# Altium footprint library ConnectMedical.PcbLib: 93 footprints (part 3 of 6)
Each footprint in its own frame and in the unit in brackets; x right, y up, seen from the top. Pads: shape width x height; smd on the part's side, far side on the other; paste and mask are expansions set on the pad; w line width, h text height; cw(c..) or ccw(c..) is an arc to the next point about the centre after c.
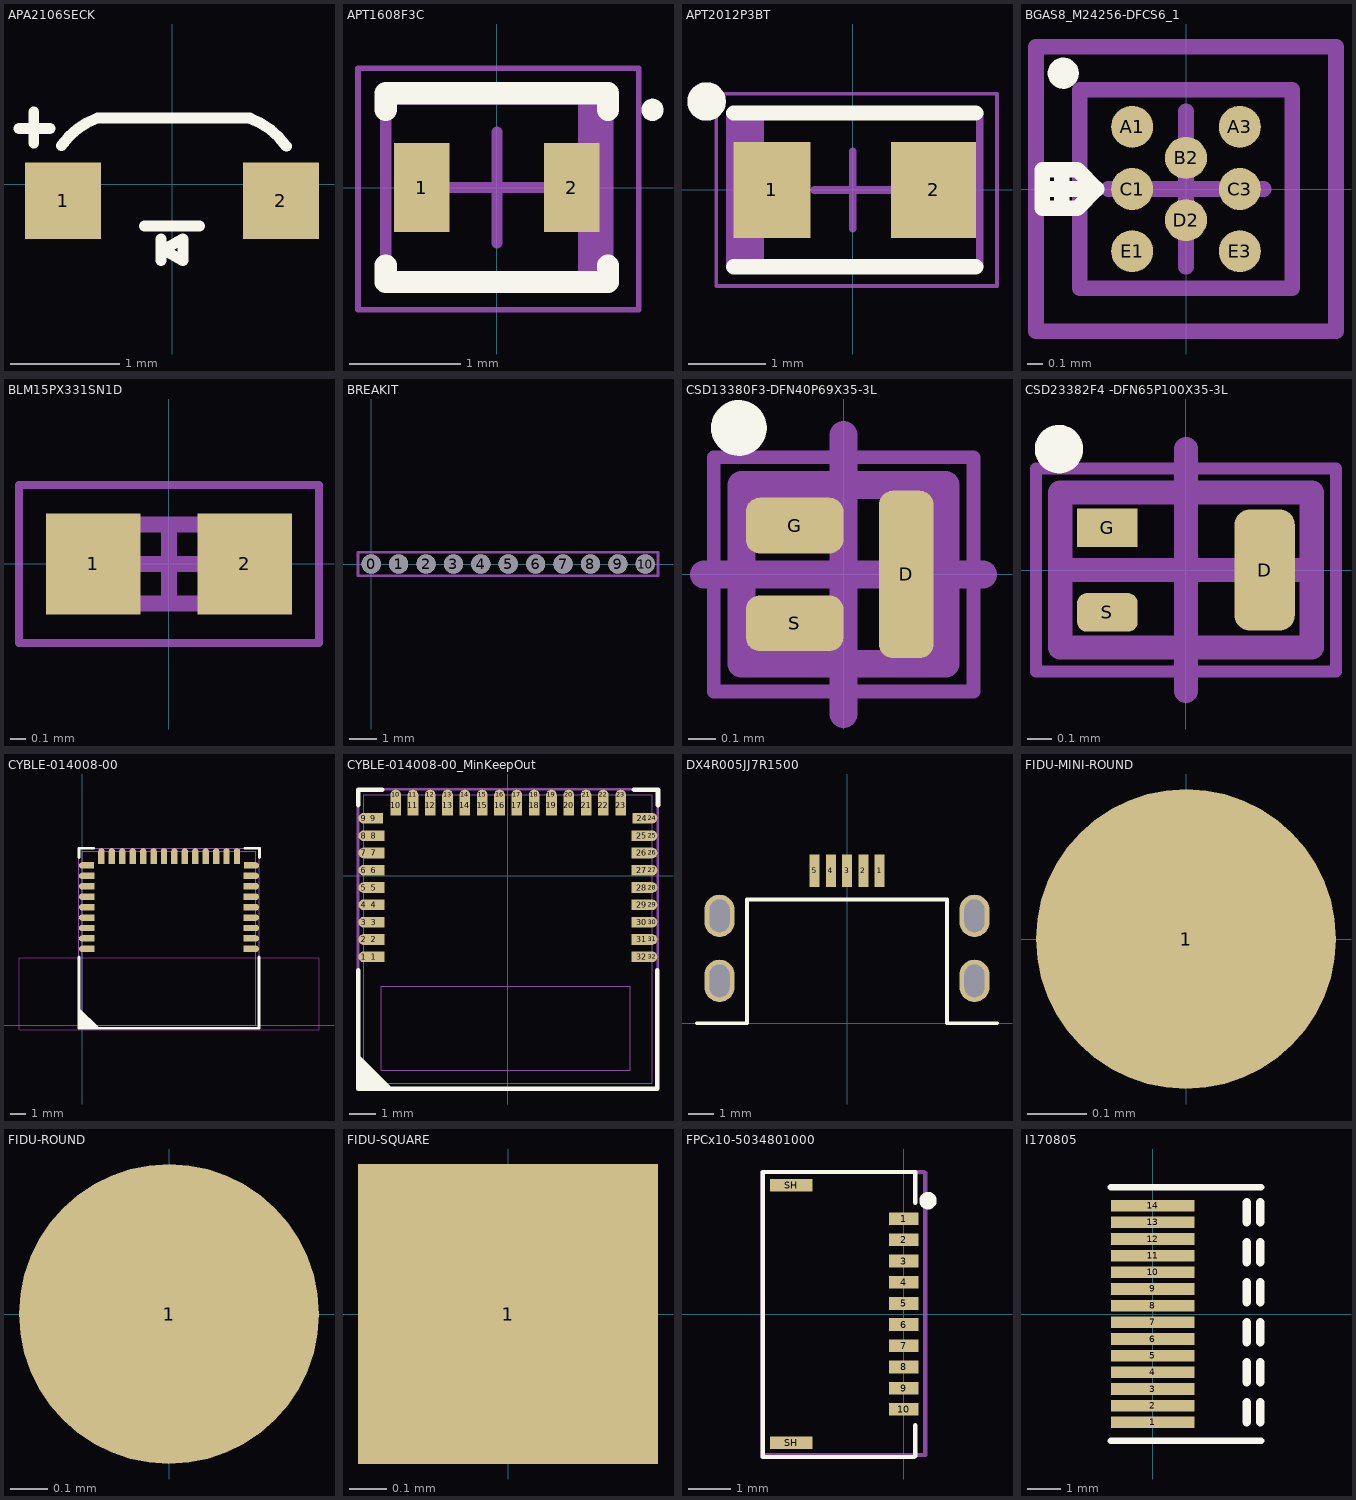
[diagram p2: the footprints below, top view; thin cyan lines are the x and y axes]

## APA2106SECK [mm] "LED_APA2106SECK"
pads (2):
  rect 0.7x0.7 smd: 1(-1,-0.15) 2(1,-0.15)
Top Overlay:
  lines w0.1: -1.405,0.514 -1.122,0.514 ; -1.27,0.381 -1.27,0.664 ; -1.017,0.354 cw(c-0.445,-0.046) -0.683,0.61 0.717,0.61 ; -0.254,-0.381 0.254,-0.381 ; -0.1,-0.7 -0.1,-0.5 ; 0.717,0.606 cw(c0.478,-0.051) 1.05,0.35 ; -0.078,-0.6 0.1,-0.7 0.1,-0.5 -0.078,-0.6
3D body "APA2106.STEP": height 0.59, standoff -0.01, extent -1.05,-0.366 1.05,0.635

## APT1608F3C [mm] "EMITTER IR 940NM 50MA 603"
height 0.75
pads (2):
  rect 0.5x0.8 smd: 1(-0.675,0) 2(0.675,0)
Top Overlay:
  circle w0.1: c1.4,0.7 r0.05
  lines w0.2: -1,-0.7 -1,-0.85 1,-0.85 1,-0.7 ; -1,0.7 -1,0.85 1,0.85 1,0.7
Mechanical 13:
  rectangle: 0.731,-0.8 1,0.8
  lines w0.1: -1,-0.8 1,-0.8 1,0.8 -1,0.8 -1,-0.8
Mechanical 14:
  text "'.Designator'" at -1.372,-0.457 h0.76
Mechanical 15:
  lines w0.05: -1.25,-1.1 1.275,-1.1 1.275,1.075 -1.25,1.075 -1.25,-1.1 ; -1.25,-1.1 -1.25,-1.1
  lines w0.1: -0.5,0 0.5,0 ; 0,-0.5 0,0.5
3D body "APT1608 v1-pin.step": height 0.75, standoff -0.01, extent -0.801,-0.4 0.81,0.4

## APT2012P3BT [mm] "PHOTOTRANSISTOR IR NPN 940NM SMD"
height 0.75
pads (2):
  rect 1x1.25 smd: 1(-1.05,0)
  rect 1.1x1.25 smd: 2(1.05,0)
Top Overlay:
  circle w0.25: c-1.9,1.15 r0.125
  lines w0.2: -1.55,-1 1.6,-1 ; -1.55,1 1.6,1
Mechanical 13:
  rectangle: -1.625,-1 -1.154,1
  lines w0.1: -1.6,-1 1.65,-1 1.65,1 -1.6,1 -1.6,-1
Mechanical 15:
  lines w0.05: -1.775,-1.25 1.875,-1.25 1.875,1.25 -1.775,1.25 -1.775,-1.25
  lines w0.1: -0.5,0 0.5,0 ; 0,-0.5 0,0.5
3D body "APT2012 v3-pin1.step": height 0.78, standoff 0.02, extent -1,-0.625 1,0.625

## BGAS8_M24256-DFCS6_1 [mm] "BGA, 8-Leads, Body 1.37x1.28mmx0.58mm, Pitch 0.40mm"
height 0.58
pads (8):
  round 0.27 smd mask-0.01: A1(-0.346,0.4) A3(0.346,0.4) B2(0,0.2) C1(-0.346,0) C3(0.346,0) D2(0,-0.2) E1(-0.346,-0.4) E3(0.346,-0.4)
Top Overlay:
  circle w0.1: c-0.79,0.745 r0.05
  lines w0.1: -0.9,0 -0.6,0 ; -0.8,-0.075 -0.8,0.125 ; -0.925,-0.125 -0.925,0.125 -0.7,0.125 -0.575,0 -0.7,-0.125 -0.925,-0.125
Mechanical 14:
  lines w0.1: -0.965,-0.914 0.965,-0.914 0.965,0.914 -0.965,0.914 -0.965,-0.914
  text "'.Designator'" at -1.295,-0.381 h0.76
Mechanical 15:
  lines w0.05: -0.95,-0.9 0.95,-0.9 0.95,0.9 -0.95,0.9 -0.95,-0.9
  lines w0.1: -0.5,0 0.5,0 ; 0,-0.5 0,0.5 ; -0.685,-0.64 0.685,-0.64 0.685,0.64 -0.685,0.64 -0.685,-0.64
3D body "M24256-DFCS6TPK v2 v1.step": height 0.55, standoff 0.14, extent -0.679,-0.636 0.679,0.635

## BLM15PX331SN1D [mm] "FERRITE BEAD 330 OHM 0402 1LN"
height 0.5
pads (2):
  rect 0.6x0.64 smd: 1(-0.48,0) 2(0.48,0)
Mechanical 13:
  lines w0.1: -0.5,-0.25 -0.5,0.25 0.5,0.25 0.5,-0.25 -0.5,-0.25
Mechanical 15:
  lines w0.05: -0.95,-0.5 -0.95,0.5 0.95,0.5 0.95,-0.5 -0.95,-0.5
  lines w0.1: -0.25,0 0.25,0 ; 0,-0.25 0,0.25
3D body "BLM15PX331SN1D.step": height 0.5, standoff 0, extent -0.5,-0.25 0.5,0.25

## BREAKIT [mm]
pads (11):
  round 0.7 hole 0.7 unplated mask+0: 0(0,0) 1(1,0) 2(2,0) 3(3,0) 4(4,0) 5(5,0) 6(6,0) 7(7,0) 8(8,0) 9(9,0) 10(10,0)
Mechanical 14:
  lines w0.1: -0.483,-0.432 10.465,-0.432 10.465,0.432 -0.483,0.432 -0.483,-0.432

## CSD13380F3-DFN40P69X35-3L [mm] "DFN, 3-Leads, Body 0.60x0.69mm, Pitch 0.40mm, IPC High Density"
height 0.35
pads (3):
  rrect50% 0.195x0.6 smd mask-0.025: D(0.225,0)
  rrect50% 0.35x0.2 smd paste-0.03 mask-0.025: G(-0.175,0.175) S(-0.175,-0.175)
Top Overlay:
  circle w0.1: c-0.375,0.525 r0.05
Mechanical 13:
  lines w0.1: -0.365,-0.32 0.365,-0.32 0.365,0.32 -0.365,0.32 -0.365,-0.32
Mechanical 14:
  text "'.Designator'" at -1.092,-0.356 h0.76
Mechanical 15:
  lines w0.05: -0.465,-0.42 -0.465,0.42 ; -0.465,-0.42 0.465,-0.42 ; -0.465,-0.42 0.465,-0.42 ; -0.465,-0.42 -0.465,0.42 ; -0.465,0.42 0.465,0.42 ; -0.465,0.42 0.465,0.42 ; 0.465,-0.42 0.465,0.42 ; 0.465,-0.42 0.465,0.42
  lines w0.1: -0.5,0 0.5,0 ; 0,-0.5 0,0.5
3D body "CSD13380F3-DFN40P69X35-3L v2-PIN1.step": height 0.35, standoff 0, extent -0.365,-0.32 0.365,0.32

## CSD23382F4 -DFN65P100X35-3L [mm] "DFN, 3-Leads, Body 0.60x1.00mm, Pitch 0.65mm, IPC High Density"
height 0.35
pads (3):
  rrect50% 0.25x0.5 smd paste+0 mask+0.04: D(0.325,0)
  rect 0.25x0.16 smd paste+0 mask+0.04: G(-0.325,0.175)
  rrect50% 0.25x0.16 smd paste+0 mask+0.04: S(-0.325,-0.175)
Top Overlay:
  circle w0.1: c-0.525,0.5 r0.05
Mechanical 13:
  lines w0.1: -0.52,-0.32 -0.52,0.32 0.52,0.32 0.52,-0.32 -0.52,-0.32
Mechanical 14:
  text "'.Designator'" at -1.067,-0.33 h0.76
Mechanical 15:
  lines w0.05: -0.62,-0.42 -0.62,0.42 0.62,0.42 0.62,-0.42 -0.62,-0.42
  lines w0.1: -0.5,0 0.5,0 ; 0,-0.5 0,0.5
3D body "CSD23382F4 -DFN65P100X35-3L v1-PIN1.step": height 0.35, standoff 0, extent -0.52,-0.32 0.52,0.32

## CYBLE-014008-00 [mil]
pads (64):
  round 16 smd mask+2: 1(0,190) 2(0,216) 3(0,242) 4(0,268) 5(0,294) 6(0,320) 7(0,346) 8(0,372) 9(0,398) 10(48,433) 11(74,433) 12(100,433) 13(126,433) 14(152,433) 15(178,433) 16(204,433) 17(230,433) 18(256,433) 19(282,433) 20(308,433) 21(334,433) 22(360,433) 23(386,433) 24(433,398) 25(433,372) 26(433,346) 27(433,320) 28(433,294) 29(433,268) 30(433,242) 31(433,216) 32(433,190)
  rect 31x16 smd mask+2: 1(15.5,190) 2(15.5,216) 3(15.5,242) 4(15.5,268) 5(15.5,294) 6(15.5,320) 7(15.5,346) 8(15.5,372) 25(417.5,372) 26(417.5,346) 27(417.5,320) 28(417.5,294) 29(417.5,268) 30(417.5,242) 31(417.5,216) 32(417.5,190)
  rect 29x16 smd mask+2: 9(14.5,398) 24(418.5,398)
  rect 16x31 smd mask+2: 10(48,417.5) 11(74,417.5) 12(100,417.5) 13(126,417.5) 14(152,417.5) 15(178,417.5) 16(204,417.5) 17(230,417.5) 18(256,417.5) 19(282,417.5) 20(308,417.5) 21(334,417.5) 22(360,417.5) 23(386,417.5)
Top Overlay:
  region: -8,43.4 -8,-8 43.4,-8
  lines w7: -8,170 -8,-8 441,-8 441,170 ; -8,418 -8,441 28,441 ; 406,441 442,441 442,418
Keep-Out Layer:
  text "Antenna Keep Out Area" at 19,69 h50
Keep-Out Layer:
  lines w1: -157.48,-11.81 -157.48,168.31 26.57,168.31 400.59,168.31 590.55,168.31 590.55,-11.81 -157.48,-11.81
Mechanical 15:
  lines w1: -8,-8 441,-8 441,441 -8,441 -8,-8 ; 0,0 433.07,0 433.07,433.07 0,433.07 0,0
Non-printed:
  text "P25" at 455.71,203.74 h39.37
  text "P33" at 454.72,361.22 h39.37
  text "P32" at 455.71,310.04 h39.37
  text "XRES" at 453.74,255.91 h39.37
  text "P24" at 455,230.7 h39.37
  text "P36" at 455,282.7 h39.37
  text "VREF" at 455,334.7 h39.37
  text "P35" at 455,386.7 h39.37
  text "GND" at 455,178.7 h39.37
  text "GND" at -86,178 h39.37
  text "P11" at -71.85,205.71 h39.37
  text "P04" at -72,387 h39.37
  text "VDD" at -84,335 h39.37
  text "P01" at -71,283 h39.37
  text "P10" at -72,231 h39.37
  text "P14" at -73.82,361.22 h39.37
  text "P07" at -70.87,311.02 h39.37
  text "P15" at -70.87,257.87 h39.37
  text "P06" at 86,455 h39.37
  text "VDR" at 138,455 h39.37
  text "P13" at 190,455 h39.37
  text "P21" at 242,455 h39.37
  text "P23" at 294,455 h39.37
  text "P34" at 346,455 h39.37
  text "P37" at 398,455 h39.37
  text "P05" at 60.04,454.72 h39.37
  text "P12" at 112.2,455.71 h39.37
  text "P26" at 164.37,454.72 h39.37
  text "P30" at 216.54,455.71 h39.37
  text "P22" at 267.72,455.71 h39.37
  text "VAN" at 319.88,455.71 h39.37
  text "P31" at 372.05,455.71 h39.37
  text "CYBLE-014008-00" at 81,257 h39.37
  text "BLE Module" at -23.62,-11.81 h39.37
3D body "CYBLE-014008-00_AP214.STEP": height 71.71, standoff 0.85, extent 1.35,0.01 434.42,433.08

## CYBLE-014008-00_MinKeepOut [mil]
pads (64):
  round 16 smd mask+2: 1(-216.5,-121.5) 2(-216.5,-95.5) 3(-216.5,-69.5) 4(-216.5,-43.5) 5(-216.5,-17.5) 6(-216.5,8.5) 7(-216.5,34.5) 8(-216.5,60.5) 9(-216.5,86.5) 10(-168.5,121.5) 11(-142.5,121.5) 12(-116.5,121.5) 13(-90.5,121.5) 14(-64.5,121.5) 15(-38.5,121.5) 16(-12.5,121.5) 17(13.5,121.5) 18(39.5,121.5) 19(65.5,121.5) 20(91.5,121.5) 21(117.5,121.5) 22(143.5,121.5) 23(169.5,121.5) 24(216.5,86.5) 25(216.5,60.5) 26(216.5,34.5) 27(216.5,8.5) 28(216.5,-17.5) 29(216.5,-43.5) 30(216.5,-69.5) 31(216.5,-95.5) 32(216.5,-121.5)
  rect 31x16 smd mask+2: 1(-201,-121.5) 2(-201,-95.5) 3(-201,-69.5) 4(-201,-43.5) 5(-201,-17.5) 6(-201,8.5) 7(-201,34.5) 8(-201,60.5) 25(201,60.5) 26(201,34.5) 27(201,8.5) 28(201,-17.5) 29(201,-43.5) 30(201,-69.5) 31(201,-95.5) 32(201,-121.5)
  rect 29x16 smd mask+2: 9(-202,86.5) 24(202,86.5)
  rect 16x31 smd mask+2: 10(-168.5,106) 11(-142.5,106) 12(-116.5,106) 13(-90.5,106) 14(-64.5,106) 15(-38.5,106) 16(-12.5,106) 17(13.5,106) 18(39.5,106) 19(65.5,106) 20(91.5,106) 21(117.5,106) 22(143.5,106) 23(169.5,106)
Top Overlay:
  region: -224.5,-268.1 -224.5,-319.5 -173.1,-319.5
  lines w7: -224.5,-141.5 -224.5,-319.5 224.5,-319.5 224.5,-141.5 ; -224.5,106.5 -224.5,129.5 -188.5,129.5 ; 189.5,129.5 225.5,129.5 225.5,106.5
Mechanical 14:
  lines w3.94: -225,-319 225,-319 225,130 -225,130 -225,-319
  text "'.Designator'" at -121,-105 h30
Mechanical 15:
  lines w1: -224.5,-319.5 -224.5,129.5 224.5,129.5 224.5,-319.5 -224.5,-319.5 ; -216.5,-311.5 -216.5,121.57 216.57,121.57 216.57,-311.5 -216.5,-311.5 ; -189.93,-291.81 184.09,-291.81 184.09,-165.83 -189.93,-165.83 -189.93,-291.81
Non-printed:
  text "BLE Module" at -240.12,-323.31 h39.37
  text "CYBLE-014008-00" at -135.5,-54.5 h39.37
  text "P31" at 155.55,144.21 h39.37
  text "VAN" at 103.38,144.21 h39.37
  text "P22" at 51.22,144.21 h39.37
  text "P30" at 0.04,144.21 h39.37
  text "P26" at -52.13,143.22 h39.37
  text "P12" at -104.3,144.21 h39.37
  text "P05" at -156.46,143.22 h39.37
  text "P37" at 181.5,143.5 h39.37
  text "P34" at 129.5,143.5 h39.37
  text "P23" at 77.5,143.5 h39.37
  text "P21" at 25.5,143.5 h39.37
  text "P13" at -26.5,143.5 h39.37
  text "VDR" at -78.5,143.5 h39.37
  text "P06" at -130.5,143.5 h39.37
  text "P15" at -287.37,-53.63 h39.37
  text "P07" at -287.37,-0.48 h39.37
  text "P14" at -290.32,49.72 h39.37
  text "P10" at -288.5,-80.5 h39.37
  text "P01" at -287.5,-28.5 h39.37
  text "VDD" at -300.5,23.5 h39.37
  text "P04" at -288.5,75.5 h39.37
  text "P11" at -288.35,-105.79 h39.37
  text "GND" at -302.5,-133.5 h39.37
  text "GND" at 238.5,-132.8 h39.37
  text "P35" at 238.5,75.2 h39.37
  text "VREF" at 238.5,23.2 h39.37
  text "P36" at 238.5,-28.8 h39.37
  text "P24" at 238.5,-80.8 h39.37
  text "XRES" at 237.24,-55.59 h39.37
  text "P32" at 239.21,-1.46 h39.37
  text "P33" at 238.22,49.72 h39.37
  text "P25" at 239.21,-107.76 h39.37
3D body "CYBLE-014008-00_AP214.STEP": height 71.71, standoff 0.85, extent -215.15,-311.49 217.92,121.58

## DX4R005JJ7R1500 [mm] "USB Connector"
pads (10):
  rect 0.4x1.3 smd: 1(1.3,6.1) 2(0.65,6.1) 3(0,6.1) 4(-0.65,6.1) 5(-1.3,6.1)
  oval 1.2x1.7 hole 1.3 slot 0.8 at 0 deg: ""(-5.1,1.7) ""(-5.1,4.3) ""(-5.1,4.3) ""(5.1,1.7) ""(5.1,4.3)
Top Overlay:
  lines w0.15: -6,0 -4,0 -4,4.95 4,4.95 4,0 6,0

## FIDU-MINI-ROUND [mil]
pads (1):
  round 20 smd paste-78.74 mask+7.99: 1(0,0)

## FIDU-ROUND [mm]
pads (1):
  round 0.8 smd paste-2 mask+0.43: 1(0,0)

## FIDU-SQUARE [mm]
pads (1):
  rect 0.8x0.8 smd paste-2 mask+0.43: 1(0,0)

## FPCx10-5034801000 [mm] "CONN FFC FPC 10POS 0.50MM R/A"
pads (12):
  rect 0.7x0.3 smd mask+0.07: 1(0,2.25) 2(0,1.75) 3(0,1.25) 4(0,0.75) 5(0,0.25) 6(0,-0.25) 7(0,-0.75) 8(0,-1.25) 9(0,-1.75) 10(0,-2.25)
  rect 1x0.3 smd mask+0.07: SH(-2.65,-3.04) SH(-2.65,3.04)
Top Overlay:
  circle w0.254: c0.575,2.675 r0.079
  lines w0.1: -3.325,-3.375 -3.325,3.35 0.275,3.35 0.275,2.625 ; -3.3,-3.375 0.25,-3.375 0.275,-3.35 0.275,-2.625
Mechanical 14:
  lines w0.1: -3.327,-3.353 -3.327,3.353 0.483,3.353 0.508,3.327 0.508,-3.327 -3.302,-3.327 -3.327,-3.353
  text "'.Designator'" at -1.194,-2.184 h0.76
3D body "5034801000.stp": height 1.88, standoff -0.02, extent -3.325,-3.35 0.275,3.35

## I170805 [mm] "OLED Display using I2C"
pads (14):
  rect 2.5x0.35 smd: 1(0,-3.25) 2(0,-2.75) 3(0,-2.25) 4(0,-1.75) 5(0,-1.25) 6(0,-0.75) 7(0,-0.25) 8(0,0.25) 9(0,0.75) 10(0,1.25) 11(0,1.75) 12(0,2.25) 13(0,2.75) 14(0,3.25)
Top Overlay:
  lines w0.2: -1.25,-3.8 3.25,-3.8 ; -1.25,3.8 3.25,3.8
  lines w0.254: 2.825,-3.25 2.825,-2.65 ; 2.825,-2.05 2.825,-1.45 ; 2.825,-0.85 2.825,-0.25 ; 2.825,0.35 2.825,0.95 ; 2.825,1.55 2.825,2.15 ; 2.825,2.75 2.825,3.35 ; 3.225,-3.25 3.225,-2.65 ; 3.225,-2.05 3.225,-1.45 ; 3.225,-0.85 3.225,-0.25 ; 3.225,0.35 3.225,0.95 ; 3.225,1.55 3.225,2.15 ; 3.225,2.75 3.225,3.35